# Altium schematic symbol library 13-Logic 数字 IC.SchLib: 324 symbols (part 10 of 30) (continued)
## M4A5-64/32-10JC (continued)

## M25P05-A
designator IC?
512-Kbit, Serial Flash Memory, 50 MHz SPI Bus Interface
pins: 1 ~{S} (in), 2 Q (out), 3 ~{W} (in), 4 VSS (power), 5 D (in), 6 C (in), 7 ~{HOLD} (in), 8 VCC (power)

## M25P32-VMF
designator IC?
32 Mbit, low-voltage, Serial Flash memory with 75-MHz SPI bus interface
pins: 1 ~{HOLD} (in), 2 VCC (power), 7 ~{S} (in), 8 Q (out), 9 ~{W}/Vpp (in), 10 VSS (power), 15 D (in), 16 C (in)

## M25P80-VMN6P
designator IC?
8 Mbit, 2.7V to 3.6V Serial Flash Embedded Memory
pins: 1 ~{S} (in), 2 DQ1 (out), 3 ~{W} (in), 4 VSS (power), 5 DQ0 (in), 6 C (in), 7 ~{HOLD} (in), 8 VCC (power)

## M25P128-VME
designator IC?
128 Mbit (Multilevel), low-voltage, Serial Flash memory with 50-MHz SPI bus interface
pins: 1 ~{S} (in), 2 Q (out), 3 ~{W}/Vpp (in), 4 VSS (power), 5 D (in), 6 C (in), 7 ~{HOLD} (in), 8 VCC (power), 9 EP (power)

## M25P128-VMF
designator IC?
128 Mbit (Multilevel), low-voltage, Serial Flash memory with 50-MHz SPI bus interface
pins: 1 ~{HOLD} (in), 2 VCC (power), 7 ~{S} (in), 8 Q (out), 9 ~{W}/Vpp (in), 10 VSS (power), 15 D (in), 16 C (in)

## M25PX80-VMN6P
designator IC?
8Mb, 2.7V to 3.6V, Dual I/O, 4KB Subsector Erase, 3V Serial Flash Memory
pins: 1 ~{S} (in), 2 DQ1 (out), 3 ~{W}/VPP (in), 4 VSS (power), 5 DQ0 (in), 6 C (in), 7 ~{HOLD} (in), 8 VCC (power)

## M27C4002-12F1
designator IC?
4 Mbit (256Kb x16) UV EPROM
pins: 1 VPP (in), 2 ~{E} (in), 3 Q15 (io), 4 Q14 (io), 5 Q13 (io), 6 Q12 (io), 7 Q11 (io), 8 Q10 (io), 9 Q9 (io), 10 Q8 (io), 11 VSS (power), 12 Q7 (io), 13 Q6 (io), 14 Q5 (io), 15 Q4 (io), 16 Q3 (io), 17 Q2 (io), 18 Q1 (io), 19 Q0 (io), 20 ~{G} (in), 21 A0 (in), 22 A1 (in), 23 A2 (in), 24 A3 (in), 25 A4 (in), 26 A5 (in), 27 A6 (in), 28 A7 (in), 29 A8 (in), 30 VSS (power), 31 A9 (in), 32 A10 (in), 33 A11 (in), 34 A12 (in), 35 A13 (in), 36 A14 (in), 37 A15 (in), 38 A16 (in), 39 A17 (in), 40 VCC (power)

## M93C46-MN
designator IC?
1Kb (x8/x16) Serial Microwire Bus EEPROM
pins: 1 S (in), 2 C (in), 3 D (in), 4 Q (out), 5 VSS (power), 6 ORG (in), 7 DU, 8 VCC (power)

## M93C46-WMN6TP
designator IC?
2.5 to 5.5 V, 1Kb (128x8) Serial Microwire Bus EEPROM
pins: 1 S (in), 2 C (in), 3 D (in), 4 Q (out), 5 VSS (power), 6 ORG (in), 7 DU, 8 VCC (power)

## M93C66-WMN6TP
designator IC?
2.5 to 5.5 V, 4Kbit (512 x 8 bit or 256 x 16 bit) MICROWIRE® Serial Access EEPROM
pins: 1 S (in), 2 C (in), 3 D (in), 4 Q (out), 5 VSS (power), 6 ORG (in), 7 DU, 8 VCC (power)

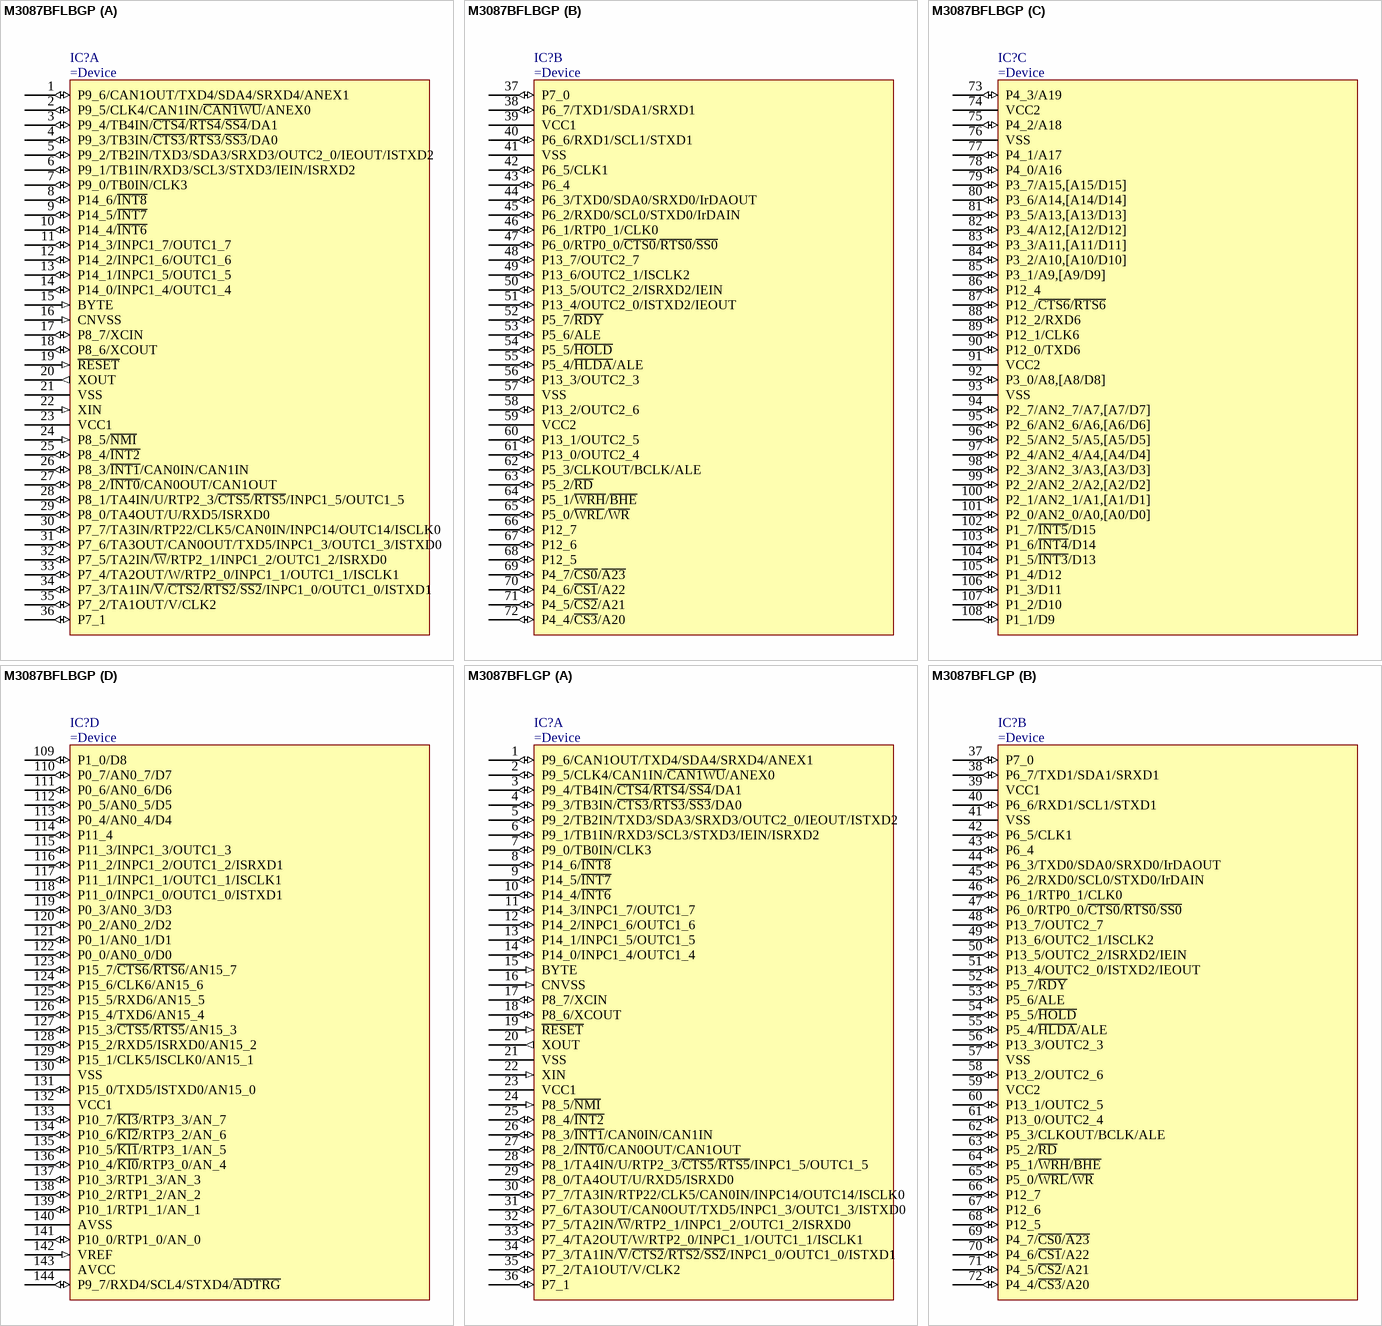
[diagram p60: symbols M3087BFLBGP to M3087BFLGP]

## M3087BFLBGP
designator IC?
Micro Controller Unit (MCU)
part A pins: 1 P9_6/CAN1OUT/TXD4/SDA4/SRXD4/ANEX1 (io), 2 P9_5/CLK4/CAN1IN/~{CAN1WU}/ANEX0 (io), 3 P9_4/TB4IN/~{CTS4}/~{RTS4}/~{SS4}/DA1 (io), 4 P9_3/TB3IN/~{CTS3}/~{RTS3}/~{SS3}/DA0 (io), 5 P9_2/TB2IN/TXD3/SDA3/SRXD3/OUTC2_0/IEOUT/ISTXD2 (io), 6 P9_1/TB1IN/RXD3/SCL3/STXD3/IEIN/ISRXD2 (io), 7 P9_0/TB0IN/CLK3 (io), 8 P14_6/~{INT8} (io), 9 P14_5/~{INT7} (io), 10 P14_4/~{INT6} (io), 11 P14_3/INPC1_7/OUTC1_7 (io), 12 P14_2/INPC1_6/OUTC1_6 (io), 13 P14_1/INPC1_5/OUTC1_5 (io), 14 P14_0/INPC1_4/OUTC1_4 (io), 15 BYTE (in), 16 CNVSS (in), 17 P8_7/XCIN (io), 18 P8_6/XCOUT (io), 19 ~{RESET} (in), 20 XOUT (out), 21 VSS (power), 22 XIN (in), 23 VCC1 (power), 24 P8_5/~{NMI} (in), 25 P8_4/~{INT2} (io), 26 P8_3/~{INT1}/CAN0IN/CAN1IN (io), 27 P8_2/~{INT0}/CAN0OUT/CAN1OUT (io), 28 P8_1/TA4IN/U/RTP2_3/~{CTS5}/~{RTS5}/INPC1_5/OUTC1_5 (io), 29 P8_0/TA4OUT/U/RXD5/ISRXD0 (io), 30 P7_7/TA3IN/RTP22/CLK5/CAN0IN/INPC14/OUTC14/ISCLK0 (io), 31 P7_6/TA3OUT/CAN0OUT/TXD5/INPC1_3/OUTC1_3/ISTXD0 (io), 32 P7_5/TA2IN/~{W}/RTP2_1/INPC1_2/OUTC1_2/ISRXD0 (io), 33 P7_4/TA2OUT/W/RTP2_0/INPC1_1/OUTC1_1/ISCLK1 (io), 34 P7_3/TA1IN/~{V}/~{CTS2}/~{RTS2}/~{SS2}/INPC1_0/OUTC1_0/ISTXD1 (io), 35 P7_2/TA1OUT/V/CLK2 (io), 36 P7_1 (io)
part B pins: 37 P7_0 (io), 38 P6_7/TXD1/SDA1/SRXD1 (io), 39 VCC1 (power), 40 P6_6/RXD1/SCL1/STXD1 (io), 41 VSS (power), 42 P6_5/CLK1 (io), 43 P6_4 (io), 44 P6_3/TXD0/SDA0/SRXD0/IrDAOUT (io), 45 P6_2/RXD0/SCL0/STXD0/IrDAIN (io), 46 P6_1/RTP0_1/CLK0 (io), 47 P6_0/RTP0_0/~{CTS0}/~{RTS0}/~{SS0} (io), 48 P13_7/OUTC2_7 (io), 49 P13_6/OUTC2_1/ISCLK2 (io), 50 P13_5/OUTC2_2/ISRXD2/IEIN (io), 51 P13_4/OUTC2_0/ISTXD2/IEOUT (io), 52 P5_7/~{RDY} (io), 53 P5_6/ALE (io), 54 P5_5/~{HOLD} (io), 55 P5_4/~{HLDA}/ALE (io), 56 P13_3/OUTC2_3 (io), 57 VSS (power), 58 P13_2/OUTC2_6 (io), 59 VCC2 (power), 60 P13_1/OUTC2_5 (io), 61 P13_0/OUTC2_4 (io), 62 P5_3/CLKOUT/BCLK/ALE (io), 63 P5_2/~{RD} (io), 64 P5_1/~{WRH}/~{BHE} (io), 65 P5_0/~{WRL}/~{WR} (io), 66 P12_7 (io), 67 P12_6 (io), 68 P12_5 (io), 69 P4_7/~{CS0}/~{A23} (io), 70 P4_6/~{CS1}/A22 (io), 71 P4_5/~{CS2}/A21 (io), 72 P4_4/~{CS3}/A20 (io)
part C pins: 73 P4_3/A19 (io), 74 VCC2 (power), 75 P4_2/A18 (io), 76 VSS (power), 77 P4_1/A17 (io), 78 P4_0/A16 (io), 79 P3_7/A15,[A15/D15] (io), 80 P3_6/A14,[A14/D14] (io), 81 P3_5/A13,[A13/D13] (io), 82 P3_4/A12,[A12/D12] (io), 83 P3_3/A11,[A11/D11] (io), 84 P3_2/A10,[A10/D10] (io), 85 P3_1/A9,[A9/D9] (io), 86 P12_4 (io), 87 P12_/~{CTS6}/~{RTS6} (io), 88 P12_2/RXD6 (io), 89 P12_1/CLK6 (io), 90 P12_0/TXD6 (io), 91 VCC2 (power), 92 P3_0/A8,[A8/D8] (io), 93 VSS (power), 94 P2_7/AN2_7/A7,[A7/D7] (io), 95 P2_6/AN2_6/A6,[A6/D6] (io), 96 P2_5/AN2_5/A5,[A5/D5] (io), 97 P2_4/AN2_4/A4,[A4/D4] (io), 98 P2_3/AN2_3/A3,[A3/D3] (io), 99 P2_2/AN2_2/A2,[A2/D2] (io), 100 P2_1/AN2_1/A1,[A1/D1] (io), 101 P2_0/AN2_0/A0,[A0/D0] (io), 102 P1_7/~{INT5}/D15 (io), 103 P1_6/~{INT4}/D14 (io), 104 P1_5/~{INT3}/D13 (io), 105 P1_4/D12 (io), 106 P1_3/D11 (io), 107 P1_2/D10 (io), 108 P1_1/D9 (io)
part D pins: 109 P1_0/D8 (io), 110 P0_7/AN0_7/D7 (io), 111 P0_6/AN0_6/D6 (io), 112 P0_5/AN0_5/D5 (io), 113 P0_4/AN0_4/D4 (io), 114 P11_4 (io), 115 P11_3/INPC1_3/OUTC1_3 (io), 116 P11_2/INPC1_2/OUTC1_2/ISRXD1 (io), 117 P11_1/INPC1_1/OUTC1_1/ISCLK1 (io), 118 P11_0/INPC1_0/OUTC1_0/ISTXD1 (io), 119 P0_3/AN0_3/D3 (io), 120 P0_2/AN0_2/D2 (io), 121 P0_1/AN0_1/D1 (io), 122 P0_0/AN0_0/D0 (io), 123 P15_7/~{CTS6}/~{RTS6}/AN15_7 (io), 124 P15_6/CLK6/AN15_6 (io), 125 P15_5/RXD6/AN15_5 (io), 126 P15_4/TXD6/AN15_4 (io), 127 P15_3/~{CTS5}/~{RTS5}/AN15_3 (io), 128 P15_2/RXD5/ISRXD0/AN15_2 (io), 129 P15_1/CLK5/ISCLK0/AN15_1 (io), 130 VSS (power), 131 P15_0/TXD5/ISTXD0/AN15_0 (io), 132 VCC1 (power), 133 P10_7/~{KI3}/RTP3_3/AN_7 (io), 134 P10_6/~{KI2}/RTP3_2/AN_6 (io), 135 P10_5/~{KI1}/RTP3_1/AN_5 (io), 136 P10_4/~{KI0}/RTP3_0/AN_4 (io), 137 P10_3/RTP1_3/AN_3 (io), 138 P10_2/RTP1_2/AN_2 (io), 139 P10_1/RTP1_1/AN_1 (io), 140 AVSS (power), 141 P10_0/RTP1_0/AN_0 (io), 142 VREF (in), 143 AVCC (power), 144 P9_7/RXD4/SCL4/STXD4/~{ADTRG} (io)

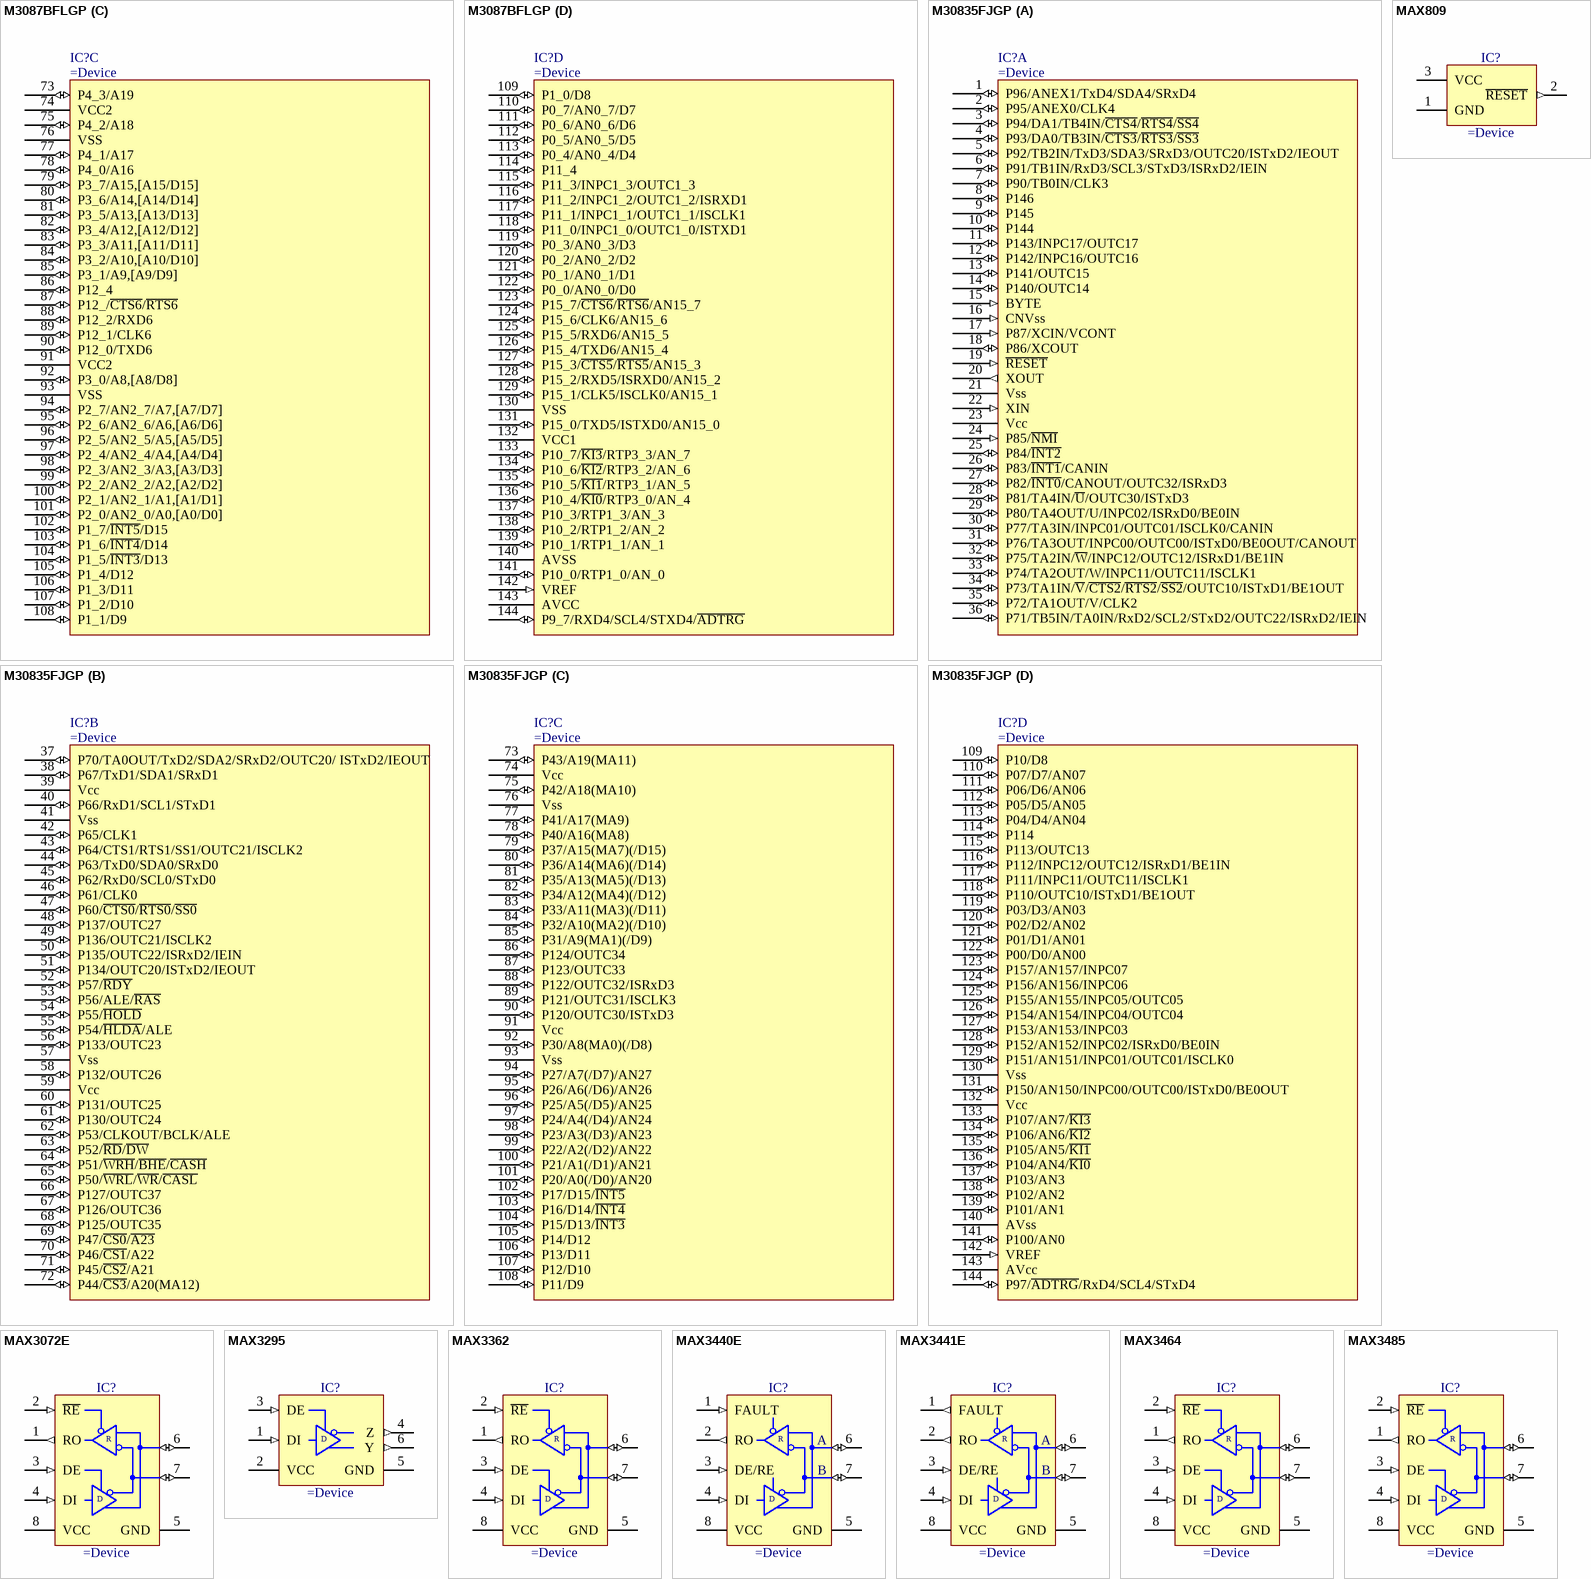
[diagram p61: symbols M3087BFLGP to MAX3485]

## M3087BFLGP
designator IC?
Micro Controller Unit (MCU)
part A pins: 1 P9_6/CAN1OUT/TXD4/SDA4/SRXD4/ANEX1 (io), 2 P9_5/CLK4/CAN1IN/~{CAN1WU}/ANEX0 (io), 3 P9_4/TB4IN/~{CTS4}/~{RTS4}/~{SS4}/DA1 (io), 4 P9_3/TB3IN/~{CTS3}/~{RTS3}/~{SS3}/DA0 (io), 5 P9_2/TB2IN/TXD3/SDA3/SRXD3/OUTC2_0/IEOUT/ISTXD2 (io), 6 P9_1/TB1IN/RXD3/SCL3/STXD3/IEIN/ISRXD2 (io), 7 P9_0/TB0IN/CLK3 (io), 8 P14_6/~{INT8} (io), 9 P14_5/~{INT7} (io), 10 P14_4/~{INT6} (io), 11 P14_3/INPC1_7/OUTC1_7 (io), 12 P14_2/INPC1_6/OUTC1_6 (io), 13 P14_1/INPC1_5/OUTC1_5 (io), 14 P14_0/INPC1_4/OUTC1_4 (io), 15 BYTE (in), 16 CNVSS (in), 17 P8_7/XCIN (io), 18 P8_6/XCOUT (io), 19 ~{RESET} (in), 20 XOUT (out), 21 VSS (power), 22 XIN (in), 23 VCC1 (power), 24 P8_5/~{NMI} (in), 25 P8_4/~{INT2} (io), 26 P8_3/~{INT1}/CAN0IN/CAN1IN (io), 27 P8_2/~{INT0}/CAN0OUT/CAN1OUT (io), 28 P8_1/TA4IN/U/RTP2_3/~{CTS5}/~{RTS5}/INPC1_5/OUTC1_5 (io), 29 P8_0/TA4OUT/U/RXD5/ISRXD0 (io), 30 P7_7/TA3IN/RTP22/CLK5/CAN0IN/INPC14/OUTC14/ISCLK0 (io), 31 P7_6/TA3OUT/CAN0OUT/TXD5/INPC1_3/OUTC1_3/ISTXD0 (io), 32 P7_5/TA2IN/~{W}/RTP2_1/INPC1_2/OUTC1_2/ISRXD0 (io), 33 P7_4/TA2OUT/W/RTP2_0/INPC1_1/OUTC1_1/ISCLK1 (io), 34 P7_3/TA1IN/~{V}/~{CTS2}/~{RTS2}/~{SS2}/INPC1_0/OUTC1_0/ISTXD1 (io), 35 P7_2/TA1OUT/V/CLK2 (io), 36 P7_1 (io)
part B pins: 37 P7_0 (io), 38 P6_7/TXD1/SDA1/SRXD1 (io), 39 VCC1 (power), 40 P6_6/RXD1/SCL1/STXD1 (io), 41 VSS (power), 42 P6_5/CLK1 (io), 43 P6_4 (io), 44 P6_3/TXD0/SDA0/SRXD0/IrDAOUT (io), 45 P6_2/RXD0/SCL0/STXD0/IrDAIN (io), 46 P6_1/RTP0_1/CLK0 (io), 47 P6_0/RTP0_0/~{CTS0}/~{RTS0}/~{SS0} (io), 48 P13_7/OUTC2_7 (io), 49 P13_6/OUTC2_1/ISCLK2 (io), 50 P13_5/OUTC2_2/ISRXD2/IEIN (io), 51 P13_4/OUTC2_0/ISTXD2/IEOUT (io), 52 P5_7/~{RDY} (io), 53 P5_6/ALE (io), 54 P5_5/~{HOLD} (io), 55 P5_4/~{HLDA}/ALE (io), 56 P13_3/OUTC2_3 (io), 57 VSS (power), 58 P13_2/OUTC2_6 (io), 59 VCC2 (power), 60 P13_1/OUTC2_5 (io), 61 P13_0/OUTC2_4 (io), 62 P5_3/CLKOUT/BCLK/ALE (io), 63 P5_2/~{RD} (io), 64 P5_1/~{WRH}/~{BHE} (io), 65 P5_0/~{WRL}/~{WR} (io), 66 P12_7 (io), 67 P12_6 (io), 68 P12_5 (io), 69 P4_7/~{CS0}/~{A23} (io), 70 P4_6/~{CS1}/A22 (io), 71 P4_5/~{CS2}/A21 (io), 72 P4_4/~{CS3}/A20 (io)
part C pins: 73 P4_3/A19 (io), 74 VCC2 (power), 75 P4_2/A18 (io), 76 VSS (power), 77 P4_1/A17 (io), 78 P4_0/A16 (io), 79 P3_7/A15,[A15/D15] (io), 80 P3_6/A14,[A14/D14] (io), 81 P3_5/A13,[A13/D13] (io), 82 P3_4/A12,[A12/D12] (io), 83 P3_3/A11,[A11/D11] (io), 84 P3_2/A10,[A10/D10] (io), 85 P3_1/A9,[A9/D9] (io), 86 P12_4 (io), 87 P12_/~{CTS6}/~{RTS6} (io), 88 P12_2/RXD6 (io), 89 P12_1/CLK6 (io), 90 P12_0/TXD6 (io), 91 VCC2 (power), 92 P3_0/A8,[A8/D8] (io), 93 VSS (power), 94 P2_7/AN2_7/A7,[A7/D7] (io), 95 P2_6/AN2_6/A6,[A6/D6] (io), 96 P2_5/AN2_5/A5,[A5/D5] (io), 97 P2_4/AN2_4/A4,[A4/D4] (io), 98 P2_3/AN2_3/A3,[A3/D3] (io), 99 P2_2/AN2_2/A2,[A2/D2] (io), 100 P2_1/AN2_1/A1,[A1/D1] (io), 101 P2_0/AN2_0/A0,[A0/D0] (io), 102 P1_7/~{INT5}/D15 (io), 103 P1_6/~{INT4}/D14 (io), 104 P1_5/~{INT3}/D13 (io), 105 P1_4/D12 (io), 106 P1_3/D11 (io), 107 P1_2/D10 (io), 108 P1_1/D9 (io)
part D pins: 109 P1_0/D8 (io), 110 P0_7/AN0_7/D7 (io), 111 P0_6/AN0_6/D6 (io), 112 P0_5/AN0_5/D5 (io), 113 P0_4/AN0_4/D4 (io), 114 P11_4 (io), 115 P11_3/INPC1_3/OUTC1_3 (io), 116 P11_2/INPC1_2/OUTC1_2/ISRXD1 (io), 117 P11_1/INPC1_1/OUTC1_1/ISCLK1 (io), 118 P11_0/INPC1_0/OUTC1_0/ISTXD1 (io), 119 P0_3/AN0_3/D3 (io), 120 P0_2/AN0_2/D2 (io), 121 P0_1/AN0_1/D1 (io), 122 P0_0/AN0_0/D0 (io), 123 P15_7/~{CTS6}/~{RTS6}/AN15_7 (io), 124 P15_6/CLK6/AN15_6 (io), 125 P15_5/RXD6/AN15_5 (io), 126 P15_4/TXD6/AN15_4 (io), 127 P15_3/~{CTS5}/~{RTS5}/AN15_3 (io), 128 P15_2/RXD5/ISRXD0/AN15_2 (io), 129 P15_1/CLK5/ISCLK0/AN15_1 (io), 130 VSS (power), 131 P15_0/TXD5/ISTXD0/AN15_0 (io), 132 VCC1 (power), 133 P10_7/~{KI3}/RTP3_3/AN_7 (io), 134 P10_6/~{KI2}/RTP3_2/AN_6 (io), 135 P10_5/~{KI1}/RTP3_1/AN_5 (io), 136 P10_4/~{KI0}/RTP3_0/AN_4 (io), 137 P10_3/RTP1_3/AN_3 (io), 138 P10_2/RTP1_2/AN_2 (io), 139 P10_1/RTP1_1/AN_1 (io), 140 AVSS (power), 141 P10_0/RTP1_0/AN_0 (io), 142 VREF (in), 143 AVCC (power), 144 P9_7/RXD4/SCL4/STXD4/~{ADTRG} (io)

## M30835FJGP
designator IC?
Single-Chip 16/32-BIT CMOS Microcomputer
part A pins: 1 P96/ANEX1/TxD4/SDA4/SRxD4 (io), 2 P95/ANEX0/CLK4 (io), 3 P94/DA1/TB4IN/~{CTS4}/~{RTS4}/~{SS4} (io), 4 P93/DA0/TB3IN/~{CTS3}/~{RTS3}/~{SS3} (io), 5 P92/TB2IN/TxD3/SDA3/SRxD3/OUTC20/ISTxD2/IEOUT (io), 6 P91/TB1IN/RxD3/SCL3/STxD3/ISRxD2/IEIN (io), 7 P90/TB0IN/CLK3 (io), 8 P146 (io), 9 P145 (io), 10 P144 (io), 11 P143/INPC17/OUTC17 (io), 12 P142/INPC16/OUTC16 (io), 13 P141/OUTC15 (io), 14 P140/OUTC14 (io), 15 BYTE (in), 16 CNVss (in), 17 P87/XCIN/VCONT (in), 18 P86/XCOUT (io), 19 ~{RESET} (in), 20 XOUT (out), 21 Vss (power), 22 XIN (in), 23 Vcc (power), 24 P85/~{NMI} (in), 25 P84/~{INT2} (io), 26 P83/~{INT1}/CANIN (io), 27 P82/~{INT0}/CANOUT/OUTC32/ISRxD3 (io), 28 P81/TA4IN/~{U}/OUTC30/ISTxD3 (io), 29 P80/TA4OUT/U/INPC02/ISRxD0/BE0IN (io), 30 P77/TA3IN/INPC01/OUTC01/ISCLK0/CANIN (io), 31 P76/TA3OUT/INPC00/OUTC00/ISTxD0/BE0OUT/CANOUT (io), 32 P75/TA2IN/~{W}/INPC12/OUTC12/ISRxD1/BE1IN (io), 33 P74/TA2OUT/W/INPC11/OUTC11/ISCLK1 (io), 34 P73/TA1IN/~{V}/~{CTS2}/~{RTS2}/~{SS2}/OUTC10/ISTxD1/BE1OUT (io), 35 P72/TA1OUT/V/CLK2 (io), 36 P71/TB5IN/TA0IN/RxD2/SCL2/STxD2/OUTC22/ISRxD2/IEIN (io)
part B pins: 37 P70/TA0OUT/TxD2/SDA2/SRxD2/OUTC20/ ISTxD2/IEOUT (io), 38 P67/TxD1/SDA1/SRxD1 (io), 39 Vcc (power), 40 P66/RxD1/SCL1/STxD1 (io), 41 Vss (power), 42 P65/CLK1 (io), 43 P64/CTS1/RTS1/SS1/OUTC21/ISCLK2 (io), 44 P63/TxD0/SDA0/SRxD0 (io), 45 P62/RxD0/SCL0/STxD0 (io), 46 P61/CLK0 (io), 47 P60/~{CTS0}/~{RTS0}/~{SS0} (io), 48 P137/OUTC27 (io), 49 P136/OUTC21/ISCLK2 (io), 50 P135/OUTC22/ISRxD2/IEIN (io), 51 P134/OUTC20/ISTxD2/IEOUT (io), 52 P57/~{RDY} (io), 53 P56/ALE/~{RAS} (io), 54 P55/~{HOLD} (io), 55 P54/~{HLDA}/ALE (io), 56 P133/OUTC23 (io), 57 Vss (power), 58 P132/OUTC26 (io), 59 Vcc (power), 60 P131/OUTC25 (io), 61 P130/OUTC24 (io), 62 P53/CLKOUT/BCLK/ALE (io), 63 P52/~{RD}/~{DW} (io), 64 P51/~{WRH}/~{BHE}/~{CASH} (io), 65 P50/~{WRL}/~{WR}/~{CASL} (io), 66 P127/OUTC37 (io), 67 P126/OUTC36 (io), 68 P125/OUTC35 (io), 69 P47/~{CS0}/~{A23} (io), 70 P46/~{CS1}/A22 (io), 71 P45/~{CS2}/A21 (io), 72 P44/~{CS3}/A20(MA12) (io)
part C pins: 73 P43/A19(MA11) (io), 74 Vcc (power), 75 P42/A18(MA10) (io), 76 Vss (power), 77 P41/A17(MA9) (io), 78 P40/A16(MA8) (io), 79 P37/A15(MA7)(/D15) (io), 80 P36/A14(MA6)(/D14) (io), 81 P35/A13(MA5)(/D13) (io), 82 P34/A12(MA4)(/D12) (io), 83 P33/A11(MA3)(/D11) (io), 84 P32/A10(MA2)(/D10) (io), 85 P31/A9(MA1)(/D9) (io), 86 P124/OUTC34 (io), 87 P123/OUTC33 (io), 88 P122/OUTC32/ISRxD3 (io), 89 P121/OUTC31/ISCLK3 (io), 90 P120/OUTC30/ISTxD3 (io), 91 Vcc (power), 92 P30/A8(MA0)(/D8) (io), 93 Vss (power), 94 P27/A7(/D7)/AN27 (io), 95 P26/A6(/D6)/AN26 (io), 96 P25/A5(/D5)/AN25 (io), 97 P24/A4(/D4)/AN24 (io), 98 P23/A3(/D3)/AN23 (io), 99 P22/A2(/D2)/AN22 (io), 100 P21/A1(/D1)/AN21 (io), 101 P20/A0(/D0)/AN20 (io), 102 P17/D15/~{INT5} (io), 103 P16/D14/~{INT4} (io), 104 P15/D13/~{INT3} (io), 105 P14/D12 (io), 106 P13/D11 (io), 107 P12/D10 (io), 108 P11/D9 (io)
part D pins: 109 P10/D8 (io), 110 P07/D7/AN07 (io), 111 P06/D6/AN06 (io), 112 P05/D5/AN05 (io), 113 P04/D4/AN04 (io), 114 P114 (io), 115 P113/OUTC13 (io), 116 P112/INPC12/OUTC12/ISRxD1/BE1IN (io), 117 P111/INPC11/OUTC11/ISCLK1 (io), 118 P110/OUTC10/ISTxD1/BE1OUT (io), 119 P03/D3/AN03 (io), 120 P02/D2/AN02 (io), 121 P01/D1/AN01 (io), 122 P00/D0/AN00 (io), 123 P157/AN157/INPC07 (io), 124 P156/AN156/INPC06 (io), 125 P155/AN155/INPC05/OUTC05 (io), 126 P154/AN154/INPC04/OUTC04 (io), 127 P153/AN153/INPC03 (io), 128 P152/AN152/INPC02/ISRxD0/BE0IN (io), 129 P151/AN151/INPC01/OUTC01/ISCLK0 (io), 130 Vss (power), 131 P150/AN150/INPC00/OUTC00/ISTxD0/BE0OUT (io), 132 Vcc (power), 133 P107/AN7/~{KI3} (io), 134 P106/AN6/~{KI2} (io), 135 P105/AN5/~{KI1} (io), 136 P104/AN4/~{KI0} (io), 137 P103/AN3 (io), 138 P102/AN2 (io), 139 P101/AN1 (io), 140 AVss (power), 141 P100/AN0 (io), 142 VREF (in), 143 AVcc (power), 144 P97/~{ADTRG}/RxD4/SCL4/STxD4 (io)

## MAX809
designator IC?
3-Pin Microprocessor Reset Circuit
pins: 1 GND (power), 2 ~{RESET} (out), 3 VCC (power)

## MAX3072E
designator IC?
+3.3V, ±15kV ESD-Protected, 250kbps, Fail-Safe, Hot-Swap, RS-485/RS-422 Transceiver
pins: 1 RO (out), 2 ~{RE} (in), 3 DE (in), 4 DI (in), 5 GND (power), 6 A (io), 7 B (io), 8 VCC (power)
text: R; D

## MAX3295
designator IC?
20Mbps, +3.3V, SOT23 RS-485/RS-422 Transmitter
pins: 1 DI (in), 2 VCC (power), 3 DE (in), 4 Z (out), 5 GND (power), 6 Y (out)
text: D

## MAX3362
designator IC?
3.3V, High-Speed, RS-485/RS-422 Transceiver
pins: 1 RO (out), 2 ~{RE} (in), 3 DE (in), 4 DI (in), 5 GND (power), 6 A (io), 7 B (io), 8 VCC (power)
text: R; D

## MAX3440E
designator IC?
±15kV ESD-Protected, ±60V Fault-Protected, 0.25Mbps, Fail-Safe RS-485 Transceiver
pins: 1 FAULT (in), 2 RO (out), 3 DE/RE (in), 4 DI (in), 5 GND (power), 6 A (io), 7 B (io), 8 VCC (power)
text: R; D

## MAX3441E
designator IC?
±15kV ESD-Protected, ±60V Fault-Protected, 2.5 to 10Mbps, Fail-Safe RS-485 Transceiver
pins: 1 FAULT (out), 2 RO (out), 3 DE/RE (in), 4 DI (in), 5 GND (power), 6 A (io), 7 B (io), 8 VCC (power)
text: R; D

## MAX3464
designator IC?
+5V, Fail-Safe, 20Mbps, Profibus RS-485/RS-422 Transceivers
pins: 1 RO (out), 2 ~{RE} (in), 3 DE (in), 4 DI (in), 5 GND (power), 6 A (io), 7 B (io), 8 VCC (power)
text: R; D

## MAX3485
designator IC?
3.3V-Powered, ±15kV ESD-Protected, 10Mbps,True RS-485/RS-422 Half Duplex Transceiver
pins: 1 RO (out), 2 ~{RE} (in), 3 DE (in), 4 DI (in), 5 GND (power), 6 A (io), 7 B (io), 8 VCC (power)
